# Altium footprint library En.PcbLib: 240 footprints (part 10 of 15)
Each footprint in its own frame and in the unit in brackets; x right, y up, seen from the top. Pads: shape width x height; smd on the part's side, far side on the other; paste and mask are expansions set on the pad; w line width, h text height; cw(c..) or ccw(c..) is an arc to the next point about the centre after c.
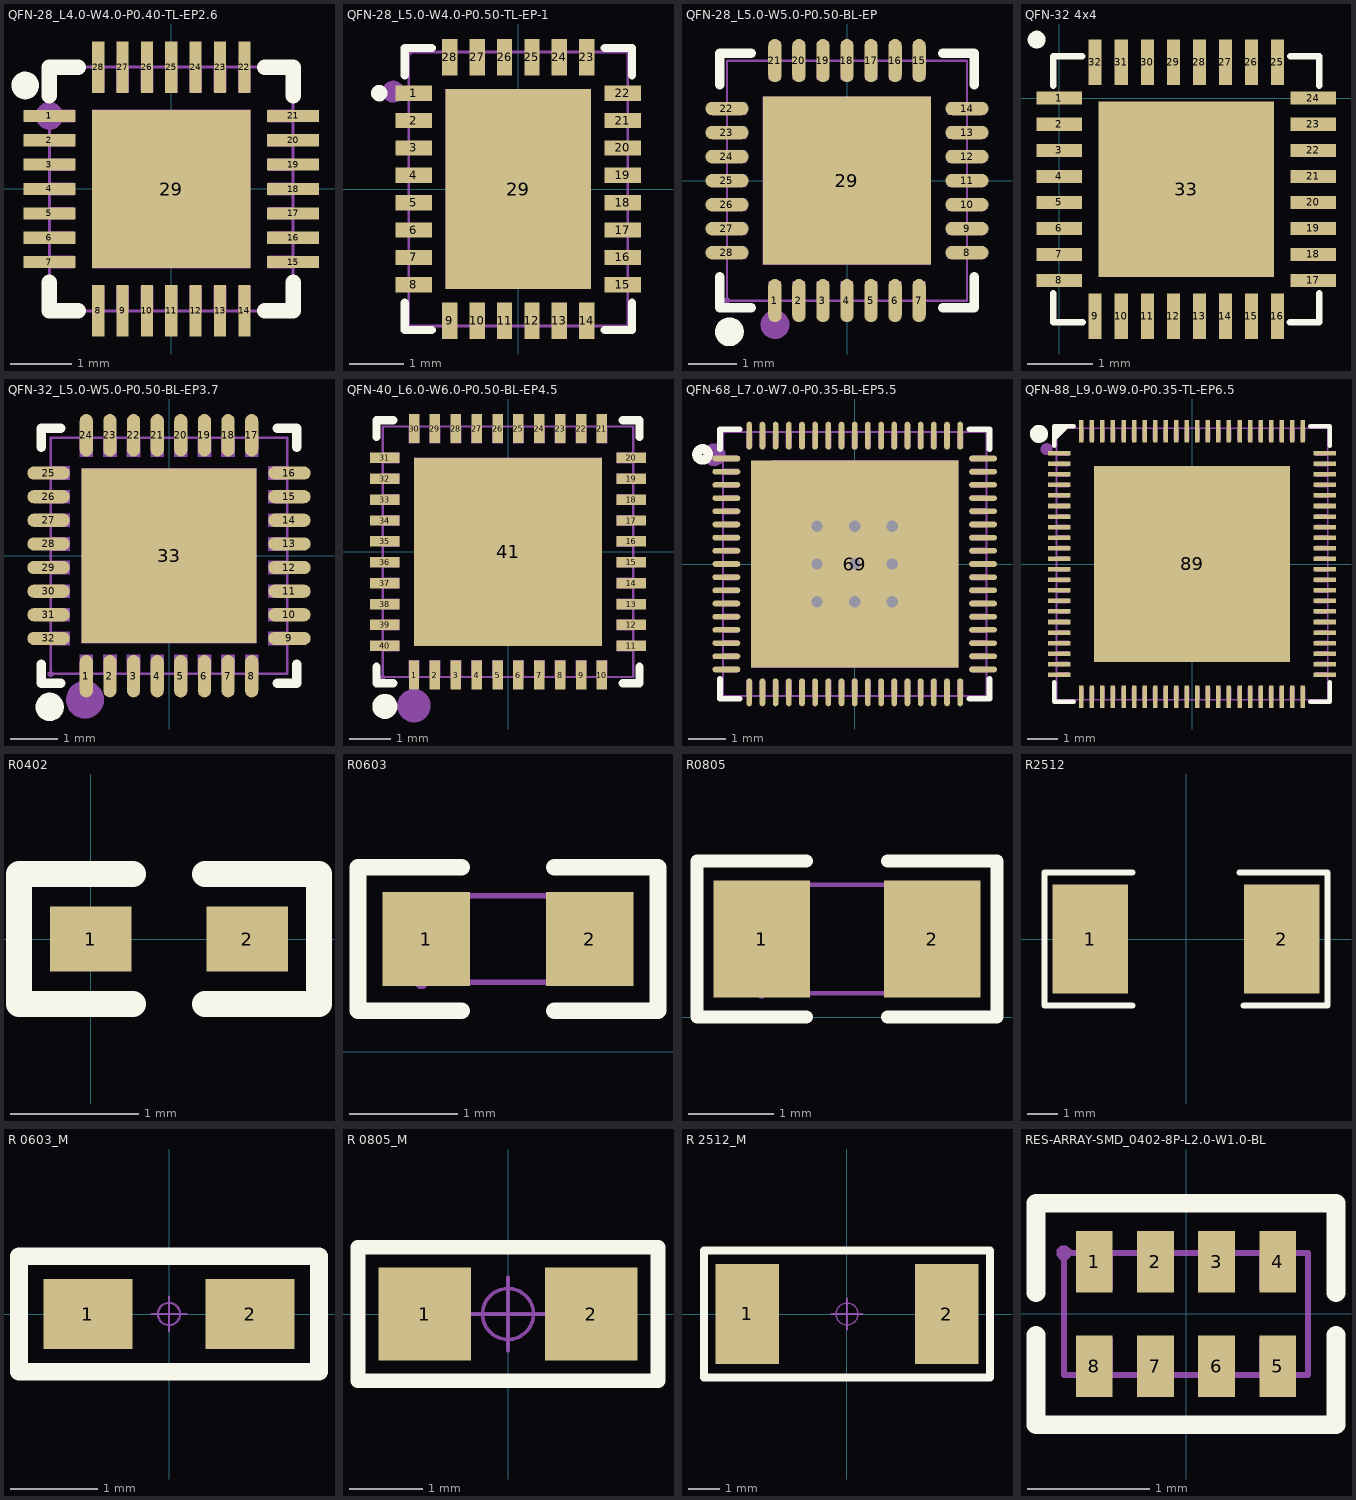
[diagram p9: the footprints below, top view; thin cyan lines are the x and y axes]

## QFN-28_L4.0-W4.0-P0.40-TL-EP2.6 [mm]
pads (29):
  rect 0.85x0.2 smd paste+0 mask+0.05: 1(-2,1.2) 2(-2,0.8) 3(-2,0.4) 4(-2,0.001) 5(-2,-0.4) 6(-2,-0.8) 7(-2,-1.2) 15(2,-1.2) 16(2,-0.8) 17(2,-0.4) 18(2,0) 19(2,0.4) 20(2,0.8) 21(2,1.2)
  rect 0.2x0.85 smd paste+0 mask+0.05: 8(-1.2,-2) 9(-0.8,-2) 10(-0.4,-2) 11(0,-2) 12(0.4,-2) 13(0.8,-2) 14(1.2,-2) 22(1.2,2) 23(0.8,2) 24(0.4,2) 25(0,2) 26(-0.4,2) 27(-0.8,2) 28(-1.2,2)
  rect 2.6x2.6 smd paste+0 mask+0.05: 29(0,0)
Top Overlay:
  circle w0.254: c-2.4,1.7 r0.1
  lines w0.254: -2,-1.531 -2,-2 -1.531,-2 ; -2,1.531 -2,2 -1.531,2 ; 1.531,-2 2,-2 2,-1.531 ; 1.531,2 2,2 2,1.531
Mechanical 6:
  circle w0.254: c-2,1.2 r0.1
Mechanical 15:
  drawing of 34 lines, arcs and shapes, not listed
3D body "mp6531agr-z.step": height 0.5, standoff 0, extent -2,-2 2,2

## QFN-28_L5.0-W4.0-P0.50-TL-EP-1 [mm]
pads (29):
  rect 0.665x0.28 smd: 1(-1.908,1.75) 2(-1.908,1.25) 3(-1.908,0.75) 4(-1.908,0.25) 5(-1.908,-0.25) 6(-1.908,-0.75) 7(-1.908,-1.25) 8(-1.908,-1.75) 15(1.908,-1.75) 16(1.908,-1.25) 17(1.908,-0.75) 18(1.908,-0.25) 19(1.908,0.25) 20(1.908,0.75) 21(1.908,1.25) 22(1.908,1.75)
  rect 0.28x0.665 smd: 9(-1.25,-2.407) 10(-0.75,-2.407) 11(-0.25,-2.407) 12(0.25,-2.407) 13(0.75,-2.407) 14(1.25,-2.407) 23(1.25,2.407) 24(0.75,2.407) 25(0.25,2.407) 26(-0.25,2.407) 27(-0.75,2.407) 28(-1.25,2.407)
  rect 2.65x3.65 smd: 29(0,0)
Top Overlay:
  circle w0.15: c-2.54,1.75 r0.075
  lines w0.152: -2.076,-2.08 -2.076,-2.576 -1.58,-2.576 ; -2.076,2.081 -2.076,2.576 -1.58,2.576 ; 1.581,-2.576 2.076,-2.576 2.076,-2.08 ; 1.581,2.576 2.076,2.576 2.076,2.081
Mechanical 6:
  circle w0.2: c-2.286,1.778 r0.1
Mechanical 15:
  drawing of 34 lines, arcs and shapes, not listed
3D body "ltc7820iufd#trpbf.step": height 0.74, standoff -0.02, extent -2.001,-2.501 2.001,2.501

## QFN-28_L5.0-W5.0-P0.50-BL-EP [mm]
pads (29):
  oval 0.28x0.9 smd paste-100 mask+0.051: 1(-1.501,-2.5) 2(-1.001,-2.5) 3(-0.501,-2.5) 4(0,-2.5) 5(0.5,-2.5) 6(1.001,-2.5) 7(1.501,-2.5) 15(1.501,2.5) 16(1.001,2.5) 17(0.5,2.5) 18(0,2.5) 19(-0.501,2.5) 20(-1.001,2.5) 21(-1.501,2.5)
  oval 0.9x0.28 smd paste-100 mask+0.051: 8(2.5,-1.501) 9(2.5,-1.001) 10(2.5,-0.501) 11(2.5,0) 12(2.5,0.5) 13(2.5,1.001) 14(2.5,1.501) 22(-2.5,1.501) 23(-2.5,1.001) 24(-2.5,0.5) 25(-2.5,0) 26(-2.5,-0.501) 27(-2.5,-1.001) 28(-2.5,-1.501)
  rect 3.5x3.5 smd paste-100 mask+0.051: 29(0,0)
Top Overlay:
  lines w0.2: -2.65,-2 -2.65,-2.65 -2,-2.65 ; -2.65,2 -2.65,2.65 -2,2.65 ; 2,-2.65 2.65,-2.65 2.65,-2 ; 2,2.65 2.65,2.65 2.65,2
  lines w0.3: -2.451,-3 ccw(c-2.45,-3.15) -2.45,-3.3 ccw(c-2.45,-3.15) -2.449,-3
Top Paste:
  drawing of 29 lines, arcs and shapes, not listed
Mechanical 6:
  circle w0.3: c-1.5,-3 r0.15
Mechanical 15:
  drawing of 34 lines, arcs and shapes, not listed
3D body "mgc3130-i_mq.step": height 0.8, standoff -0.02, extent -2.497,-2.497 2.523,2.523

## QFN-32 4x4 [mm]
pads (33):
  rect 0.7x0.2 smd mask+0.05: 1(0,0) 2(0,-0.4) 3(0,-0.8) 4(0,-1.2) 5(0,-1.6) 6(0,-2) 7(0,-2.4) 8(0,-2.8) 17(3.9,-2.8) 18(3.9,-2.4) 19(3.9,-2) 20(3.9,-1.6) 21(3.9,-1.2) 22(3.9,-0.8) 23(3.9,-0.4) 24(3.9,0)
  rect 0.2x0.7 smd mask+0.05: 9(0.55,-3.35) 10(0.95,-3.35) 11(1.35,-3.35) 12(1.75,-3.35) 13(2.15,-3.35) 14(2.55,-3.35) 15(2.95,-3.35) 16(3.35,-3.35) 25(3.35,0.55) 26(2.95,0.55) 27(2.55,0.55) 28(2.15,0.55) 29(1.75,0.55) 30(1.35,0.55) 31(0.95,0.55) 32(0.55,0.55)
  rect 2.7x2.7 smd mask+0.05: 33(1.95,-1.4)
Top Overlay:
  circle w0.254: c-0.35,0.9 r0.01
  lines w0.1: -0.095,-2.995 -0.095,-3.442 0.358,-3.442 ; -0.095,0.195 -0.095,0.648 0.352,0.648 ; 3.542,-3.442 3.995,-3.442 3.995,-2.995 ; 3.55,0.648 3.995,0.648 3.995,0.195
3D body "QFN-32_MP2980_MNP.step": height 0.94, standoff 0, extent -0.095,-3.442 3.995,0.648

## QFN-32_L5.0-W5.0-P0.50-BL-EP3.7 [mm]
pads (33):
  oval 0.28x0.9 smd paste-100 mask+0.05: 1(-1.75,-2.55) 2(-1.25,-2.55) 3(-0.75,-2.55) 4(-0.25,-2.55) 5(0.25,-2.55) 6(0.75,-2.55) 7(1.25,-2.55) 8(1.75,-2.55) 17(1.75,2.55) 18(1.25,2.55) 19(0.75,2.55) 20(0.25,2.55) 21(-0.25,2.55) 22(-0.75,2.55) 23(-1.25,2.55) 24(-1.75,2.55)
  oval 0.9x0.28 smd paste-100 mask+0.05: 9(2.55,-1.75) 10(2.55,-1.25) 11(2.55,-0.75) 12(2.55,-0.25) 13(2.55,0.25) 14(2.55,0.75) 15(2.55,1.25) 16(2.55,1.75) 25(-2.55,1.75) 26(-2.55,1.25) 27(-2.55,0.75) 28(-2.55,0.25) 29(-2.55,-0.25) 30(-2.55,-0.75) 31(-2.55,-1.25) 32(-2.55,-1.75)
  rect 3.7x3.7 smd paste-100 mask+0.05: 33(0,0)
Top Overlay:
  lines w0.2: -2.7,-2.295 -2.7,-2.7 -2.295,-2.7 ; -2.7,2.295 -2.7,2.7 -2.295,2.7 ; 2.295,-2.7 2.7,-2.7 2.7,-2.295 ; 2.295,2.7 2.7,2.7 2.7,2.295
  lines w0.3: -2.528,-3.05 ccw(c-2.527,-3.2) -2.527,-3.35 ccw(c-2.527,-3.2) -2.525,-3.05
Top Paste:
  drawing of 33 lines, arcs and shapes, not listed
Mechanical 6:
  circle w0.4: c-1.778,-3.048 r0.2
Mechanical 15:
  drawing of 38 lines, arcs and shapes, not listed
3D body "ip6538-ac.step": height 0.94, standoff 0.01, extent -2.51,-2.51 2.51,2.51

## QFN-40_L6.0-W6.0-P0.50-BL-EP4.5 [mm]
pads (41):
  rect 0.25x0.7 smd paste-100 mask+0.051: 1(-2.25,-2.95) 2(-1.75,-2.95) 3(-1.25,-2.95) 4(-0.75,-2.95) 5(-0.25,-2.95) 6(0.25,-2.95) 7(0.75,-2.95) 8(1.25,-2.95) 9(1.75,-2.95) 10(2.25,-2.95) 21(2.25,2.95) 22(1.75,2.95) 23(1.25,2.95) 24(0.75,2.95) 25(0.25,2.95) 26(-0.25,2.95) 27(-0.75,2.95) 28(-1.25,2.95) 29(-1.75,2.95) 30(-2.25,2.95)
  rect 0.7x0.25 smd paste-100 mask+0.051: 11(2.95,-2.25) 12(2.95,-1.75) 13(2.95,-1.25) 14(2.95,-0.75) 15(2.95,-0.25) 16(2.95,0.25) 17(2.95,0.75) 18(2.95,1.25) 19(2.95,1.75) 20(2.95,2.25) 31(-2.95,2.25) 32(-2.95,1.75) 33(-2.95,1.25) 34(-2.95,0.75) 35(-2.95,0.25) 36(-2.95,-0.25) 37(-2.95,-0.75) 38(-2.95,-1.25) 39(-2.95,-1.75) 40(-2.95,-2.25)
  rect 4.5x4.5 smd paste-100 mask+0.051: 41(0,0)
Top Overlay:
  lines w0.2: -3.15,-2.75 -3.15,-3.15 -2.75,-3.15 ; -3.15,2.75 -3.15,3.15 -2.75,3.15 ; 2.75,-3.15 3.15,-3.15 3.15,-2.75 ; 2.75,3.15 3.15,3.15 3.15,2.75
  lines w0.3: -2.949,-3.551 ccw(c-2.948,-3.701) -2.948,-3.851 ccw(c-2.948,-3.701) -2.946,-3.551
Top Paste:
  drawing of 41 lines, arcs and shapes, not listed
Mechanical 6:
  circle w0.4: c-2.25,-3.683 r0.2
Mechanical 15:
  drawing of 46 lines, arcs and shapes, not listed
3D body "drv8323hrtar.step": height 0.83, standoff 0.01, extent -3.01,-3.01 3.01,3.01

## QFN-68_L7.0-W7.0-P0.35-BL-EP5.5 [mm]
pads (69):
  oval 0.74x0.15 smd paste-100 mask+0.051: 1(-3.407,2.8) 2(-3.407,2.45) 3(-3.407,2.1) 4(-3.407,1.75) 5(-3.407,1.4) 6(-3.407,1.05) 7(-3.407,0.7) 8(-3.407,0.35) 9(-3.407,0) 10(-3.407,-0.35) 11(-3.407,-0.7) 12(-3.407,-1.05) 13(-3.407,-1.4) 14(-3.407,-1.75) 15(-3.407,-2.1) 16(-3.407,-2.45) 17(-3.407,-2.8) 35(3.407,-2.8) 36(3.407,-2.45) 37(3.407,-2.1) 38(3.407,-1.75) 39(3.407,-1.4) 40(3.407,-1.05) 41(3.407,-0.7) 42(3.407,-0.35) 43(3.407,0) 44(3.407,0.35) 45(3.407,0.7) 46(3.407,1.05) 47(3.407,1.4) 48(3.407,1.75) 49(3.407,2.1) 50(3.407,2.45) 51(3.407,2.8)
  oval 0.15x0.74 smd paste-100 mask+0.051: 18(-2.8,-3.407) 19(-2.45,-3.407) 20(-2.1,-3.407) 21(-1.75,-3.407) 22(-1.4,-3.407) 23(-1.05,-3.407) 24(-0.7,-3.407) 25(-0.35,-3.407) 26(0,-3.407) 27(0.35,-3.407) 28(0.7,-3.407) 29(1.05,-3.407) 30(1.4,-3.407) 31(1.75,-3.407) 32(2.1,-3.407) 33(2.45,-3.407) 34(2.8,-3.407) 52(2.8,3.407) 53(2.45,3.407) 54(2.1,3.407) 55(1.75,3.407) 56(1.4,3.407) 57(1.05,3.407) 58(0.7,3.407) 59(0.35,3.407) 60(0,3.407) 61(-0.35,3.407) 62(-0.7,3.407) 63(-1.05,3.407) 64(-1.4,3.407) 65(-1.75,3.407) 66(-2.1,3.407) 67(-2.45,3.407) 68(-2.8,3.407)
  rect 5.5x5.5 smd paste-100 mask+0.051: 69(0,0)
via -1,1 diameter 0.6 hole 0.3
via 0,1 diameter 0.6 hole 0.3
via 1,1 diameter 0.6 hole 0.3
via -1,0 diameter 0.6 hole 0.3
via 0,0 diameter 0.6 hole 0.3
via 1,0 diameter 0.6 hole 0.3
via -1,-1 diameter 0.6 hole 0.3
via 0,-1 diameter 0.6 hole 0.3
via 1,-1 diameter 0.6 hole 0.3
Top Overlay:
  circle w0.254: c-4.04,2.91 r0.148
  lines w0.152: -3.576,-3.05 -3.576,-3.576 -3.05,-3.576 ; -3.576,3.05 -3.576,3.576 -3.05,3.576 ; 3.05,-3.576 3.576,-3.576 3.576,-3.05 ; 3.05,3.576 3.576,3.576 3.576,3.05
Top Paste:
  drawing of 69 lines, arcs and shapes, not listed
Mechanical 6:
  circle w0.3: c-3.73,2.9 r0.15
Mechanical 15:
  drawing of 74 lines, arcs and shapes, not listed
3D body "rk817-5.step": height 0.75, standoff 0, extent -3.5,-3.5 3.5,3.5

## QFN-88_L9.0-W9.0-P0.35-TL-EP6.5 [mm]
pads (89):
  rect 0.74x0.15 smd paste-100 mask+0.051: 1(-4.407,3.675) 2(-4.407,3.325) 3(-4.407,2.975) 4(-4.407,2.625) 5(-4.407,2.275) 6(-4.407,1.925) 7(-4.407,1.575) 8(-4.407,1.225) 9(-4.407,0.875) 10(-4.407,0.525) 11(-4.407,0.175) 12(-4.407,-0.175) 13(-4.407,-0.525) 14(-4.407,-0.875) 15(-4.407,-1.225) 16(-4.407,-1.575) 17(-4.407,-1.925) 18(-4.407,-2.275) 19(-4.407,-2.625) 20(-4.407,-2.975) 21(-4.407,-3.325) 22(-4.407,-3.675) 45(4.407,-3.675) 46(4.407,-3.325) 47(4.407,-2.975) 48(4.407,-2.625) 49(4.407,-2.275) 50(4.407,-1.925) 51(4.407,-1.575) 52(4.407,-1.225) 53(4.407,-0.875) 54(4.407,-0.525) 55(4.407,-0.175) 56(4.407,0.175) 57(4.407,0.525) 58(4.407,0.875) 59(4.407,1.225) 60(4.407,1.575) 61(4.407,1.925) 62(4.407,2.275) 63(4.407,2.625) 64(4.407,2.975) 65(4.407,3.325) 66(4.407,3.675)
  rect 0.15x0.74 smd paste-100 mask+0.051: 23(-3.675,-4.407) 24(-3.325,-4.407) 25(-2.975,-4.407) 26(-2.625,-4.407) 27(-2.275,-4.407) 28(-1.925,-4.407) 29(-1.575,-4.407) 30(-1.225,-4.407) 31(-0.875,-4.407) 32(-0.525,-4.407) 33(-0.175,-4.407) 34(0.175,-4.407) 35(0.525,-4.407) 36(0.875,-4.407) 37(1.225,-4.407) 38(1.575,-4.407) 39(1.925,-4.407) 40(2.275,-4.407) 41(2.625,-4.407) 42(2.975,-4.407) 43(3.325,-4.407) 44(3.675,-4.407) 67(3.675,4.407) 68(3.325,4.407) 69(2.975,4.407) 70(2.625,4.407) 71(2.275,4.407) 72(1.925,4.407) 73(1.575,4.407) 74(1.225,4.407) 75(0.875,4.407) 76(0.525,4.407) 77(0.175,4.407) 78(-0.175,4.407) 79(-0.525,4.407) 80(-0.875,4.407) 81(-1.225,4.407) 82(-1.575,4.407) 83(-1.925,4.407) 84(-2.275,4.407) 85(-2.625,4.407) 86(-2.975,4.407) 87(-3.325,4.407) 88(-3.675,4.407)
  rect 6.5x6.5 smd paste-100 mask+0.051: 89(0,0)
Top Overlay:
  circle w0.4: c-5.08,4.318 r0.1
  region: -4.576,4.576 -4.576,4.064 -4.064,4.576
  lines w0.152: -4.576,-3.925 -4.576,-4.576 -3.925,-4.576 ; -4.576,3.925 -4.576,4.576 -3.925,4.576 ; 3.925,-4.576 4.576,-4.576 4.576,-3.925 ; 3.925,4.576 4.576,4.576 4.576,3.925
Top Paste:
  drawing of 89 lines, arcs and shapes, not listed
Mechanical 6:
  circle w0.2: c-4.826,3.81 r0.1
  region: -4.572,4.572 -4.572,4.064 -4.064,4.572
Mechanical 15:
  drawing of 94 lines, arcs and shapes, not listed
3D body "v851s.step": height 0.83, standoff -0.05, extent -4.501,-4.501 4.501,4.501

## R0402 [mil] "1/16W"
pads (2):
  rect 25x20 smd: 1(0,0) 2(48.2,0)
Top Overlay:
  lines w8: 13,-20 -22,-20 -22,20 13,20 ; 35.2,-20 70.2,-20 70.2,20 35.2,20
3D body "R0402.STEP": height 13.78, standoff 0, extent 4.51,-9.84 43.88,9.84

## R0603 [mm]
pads (2):
  rect 0.806x0.864 smd paste-100 mask+0.051: 1(33.906,1.042) 2(35.412,1.042)
Top Overlay:
  lines w0.152: 34.233,0.381 33.274,0.381 33.274,1.702 34.233,1.702 ; 35.085,0.381 36.044,0.381 36.044,1.702 35.085,1.702
Top Paste:
  region: 34.304,1.442 34.304,1.214 33.924,1.214 33.924,0.884 34.304,0.884 34.304,0.642 34.254,0.592 33.464,0.592 33.414,0.642 33.414,1.442 33.464,1.492 34.254,1.492
  region: 35.854,1.492 35.054,1.492 35.004,1.442 35.004,1.214 35.374,1.214 35.374,0.884 35.004,0.884 35.004,0.642 35.054,0.592 35.854,0.592 35.904,0.642 35.904,1.442
Mechanical 15:
  region: 33.919,0.642 33.919,0.666 33.884,0.702 33.834,0.702 33.799,0.666 33.799,0.642 33.799,0.617 33.834,0.582 33.884,0.582 33.919,0.617
  region: 35.459,0.642 35.459,1.442 35.159,1.442 35.159,0.642
  region: 33.859,0.642 33.859,1.442 34.159,1.442 34.159,0.642
  lines w0.051: 33.859,0.642 35.459,0.642 35.459,1.442 33.859,1.442 33.859,0.642
3D body "User Library-SMD RESISTOR-1.SLDPRT": height 0.45, standoff 0, extent 33.871,0.616 35.471,1.416

## R0805 [mm]
pads (2):
  rect 1.133x1.377 smd paste-100 mask+0.051: 1(9.016,0.917) 2(11.016,0.917)
Top Overlay:
  lines w0.152: 9.54,0 8.255,0 8.255,1.834 9.54,1.834 ; 10.492,0 11.777,0 11.777,1.834 10.492,1.834
Top Paste:
  region: 10.466,0.277 10.466,0.697 10.911,0.697 10.911,1.147 10.471,1.147 10.466,1.557 10.516,1.607 11.666,1.607 11.716,1.557 11.716,0.277 11.666,0.227 10.516,0.227
  region: 8.316,0.277 8.316,1.557 8.366,1.607 9.516,1.607 9.566,1.557 9.571,1.147 9.121,1.147 9.121,0.697 9.561,0.697 9.566,0.277 9.516,0.227 8.366,0.227
Mechanical 15:
  region: 9.076,0.28 9.075,0.304 9.04,0.337 8.992,0.337 8.957,0.304 8.956,0.28 8.957,0.256 8.992,0.222 9.04,0.222 9.075,0.256
  region: 11.016,0.28 11.016,1.555 10.616,1.555 10.616,0.28
  region: 9.016,0.28 9.016,1.555 9.416,1.555 9.416,0.28
  lines w0.051: 9.016,0.28 11.016,0.28 11.016,1.555 9.016,1.555 9.016,0.28
3D body "User Library-SMD RESISTOR-1 (1).SLDPRT": height 0.58, standoff -0.02, extent 9.033,0.302 11.033,1.552

## R2512 [mm]
pads (2):
  rect 2.5x3.6 smd: 1(-3.175,0) 2(3.175,0)
Top Overlay:
  lines w0.2: -1.778,-2.2 -4.699,-2.2 -4.699,2.2 -1.778,2.2 ; 1.778,2.2 4.699,2.2 4.699,-2.2 1.905,-2.2
3D body "User Library-SMD RESISTOR-1 (2).SLDPRT": height 0.58, standoff -0.02, extent -3.2,-1.6 3.2,1.6

## R 0603_M [mil] "1/10W贴片电阻"
height 370.08
pads (2):
  rect 40x31.5 smd: 1(-36.5,0) 2(36.5,0)
Top Overlay:
  lines w8: -67.5,-26 -67.5,26 67.5,26 67.5,-26 -67.5,-26
Mechanical 15:
  circle w1: c0,0 r5
  lines w1: -7.87,0 7.87,0 ; 0,-7.87 0,7.87
3D body "R 0603.STEP": height 15.79, standoff -0.13, extent -31.5,-15.75 31.5,15.75

## R 0805_M [mil] "1/8W贴片电阻"
pads (2):
  rect 50x50 smd: 1(-45,0) 2(45,0)
Top Overlay:
  lines w8: -81,-36 -81,36 81,36 81,-36 -81,-36
Mechanical 15:
  circle w1.97: c0,0 r13.78
  lines w1.97: -19.68,0 19.68,0 ; 0,-19.68 0,19.68
3D body "R 0805.STEP": height 19.72, standoff -0.24, extent -39.37,-24.61 39.37,24.61

## R 2512_M [mm] "1W贴片电阻"
height 9.4
pads (2):
  rect 2.032x3.2 smd: 1(-3.2,0) 2(3.2,0)
Top Overlay:
  lines w0.254: -4.572,-2.032 -4.572,2.032 4.572,2.032 4.572,-2.032 -4.572,-2.032
Mechanical 15:
  circle w0.05: c0,0 r0.35
  lines w0.05: -0.5,0 0.5,0 ; 0,-0.5 0,0.5
3D body "R 2512.STEP": height 0.55, standoff -0.02, extent -3.2,-1.6 3.2,1.6

## RES-ARRAY-SMD_0402-8P-L2.0-W1.0-BL [mm]
pads (8):
  rect 0.3x0.505 smd: 1(-0.75,0.427) 2(-0.25,0.427) 3(0.25,0.427) 4(0.75,0.427) 5(0.75,-0.427) 6(0.25,-0.427) 7(-0.25,-0.427) 8(-0.75,-0.427)
Top Overlay:
  lines w0.152: -1.229,-0.175 -1.229,-0.909 1.229,-0.909 1.229,-0.175 ; -1.229,0.175 -1.229,0.909 1.229,0.909 1.229,0.175
Mechanical 15:
  region: 0.6,-0.5 0.6,-0.2 0.9,-0.2 0.9,-0.5
  region: 0.1,-0.5 0.1,-0.2 0.4,-0.2 0.4,-0.5
  region: -0.4,-0.5 -0.4,-0.2 -0.1,-0.2 -0.1,-0.5
  region: -0.9,-0.5 -0.9,-0.2 -0.6,-0.2 -0.6,-0.5
  region: 0.6,0.5 0.6,0.2 0.9,0.2 0.9,0.5
  region: 0.1,0.5 0.1,0.2 0.4,0.2 0.4,0.5
  region: -0.4,0.5 -0.4,0.2 -0.1,0.2 -0.1,0.5
  region: -0.9,0.5 -0.9,0.2 -0.6,0.2 -0.6,0.5
  region: -0.94,0.5 -0.941,0.524 -0.976,0.559 -1.024,0.559 -1.059,0.524 -1.06,0.5 -1.059,0.475 -1.024,0.441 -0.975,0.441 -0.941,0.475
  lines w0.051: -1,-0.5 1,-0.5 1,0.5 -1,0.5 -1,-0.5
3D body "4d02wgj0103tce.step": height 0.45, standoff 0, extent -1.001,-0.5 1,0.5